# Altium footprint library Footprints.PcbLib: 45 footprints (part 2 of 3)
Each footprint in its own frame and in the unit in brackets; x right, y up, seen from the top. Pads: shape width x height; smd on the part's side, far side on the other; paste and mask are expansions set on the pad; w line width, h text height; cw(c..) or ccw(c..) is an arc to the next point about the centre after c.
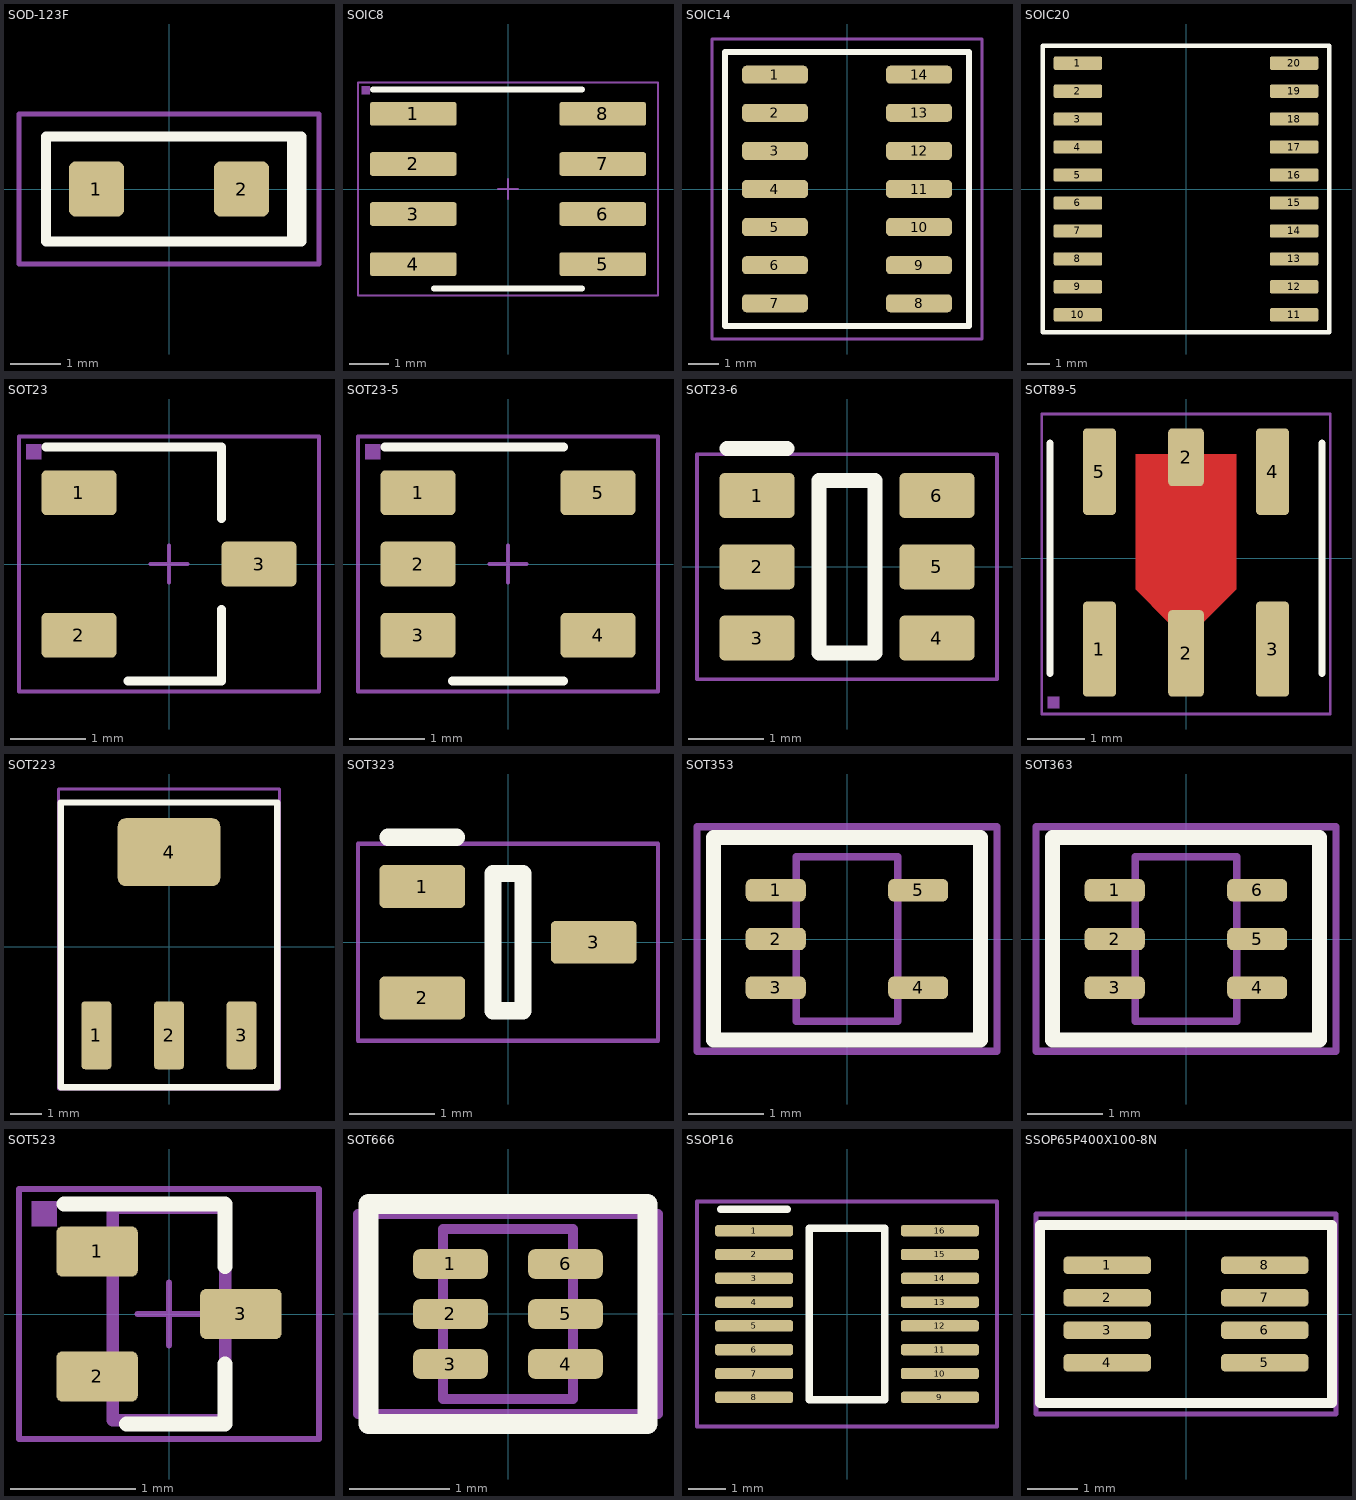
[diagram p1: the footprints below, top view; thin cyan lines are the x and y axes]

## SOD-123F [mm]
pads (2):
  rrect23% 1.1x1.1 smd: 1(-1.45,0) 2(1.45,0)
Top Overlay:
  lines w0.2: 2.464,-1.05 2.65,-1.05 2.65,1.05 2.464,1.05 ; 2.464,-1.05 2.464,1.05 ; 2.464,-1.05 -2.464,-1.05 -2.464,1.05 2.464,1.05
15. Courtyard TOP:
  lines w0.1: -3,-1.5 -3,1.5 3,1.5 3,-1.5 -3,-1.5
  text ".designator" at -1.5,-0.5 h1
3D body: height 1.35, standoff 0, extent -1.85,-0.775 1.85,0.775

## SOIC8 [mm] "SOIC, 8-Leads, Body 5,0x4,0mm (max), Pitch 1,27mm, IPC Medium Density"
height 1.75
pads (8):
  rrect23% 2.2x0.6 smd: 1(-2.4,1.905) 2(-2.4,0.635) 3(-2.4,-0.635) 4(-2.4,-1.905) 5(2.4,-1.905) 6(2.4,-0.635) 7(2.4,0.635) 8(2.4,1.905)
Top Overlay:
  lines w0.15: -3.425,2.525 1.875,2.525 ; -1.875,-2.525 1.875,-2.525
15. Courtyard TOP:
  lines w0.05: -0.25,0 0.25,0 ; 0,-0.25 0,0.25 ; -3.8,-2.7 -3.8,2.7 3.8,2.7 3.8,-2.7 -3.8,-2.7
18. Assembly TOP:
  region: -3.7,2.6 -3.5,2.6 -3.5,2.4 -3.7,2.4
  lines w0.05: -3.8,-2.7 -3.8,2.7 3.8,2.7 3.8,-2.7 -3.8,-2.7
  text ".designator" at -3.3,-0.7 h1.5
3D body: height 1.75, standoff 0, extent -3,-2.45 3,2.45

## SOIC14 [mm]
height 1.75
pads (14):
  rrect50% 2.2x0.6 smd: 1(-2.4,3.81) 2(-2.4,2.54) 3(-2.4,1.27) 4(-2.4,0) 5(-2.4,-1.27) 6(-2.4,-2.54) 7(-2.4,-3.81) 8(2.4,-3.81) 9(2.4,-2.54) 10(2.4,-1.27) 11(2.4,0) 12(2.4,1.27) 13(2.4,2.54) 14(2.4,3.81)
Top Overlay:
  lines w0.2: -4.064,-4.572 4.064,-4.572 4.064,4.572 -4.064,4.572 -4.064,-4.572
15. Courtyard TOP:
  lines w0.1: -4.5,-5 4.5,-5 4.5,5 -4.5,5 -4.5,-5
  text "." at -3.2,3.9 h1
  text ".designator" at -1.905,-0.635 h2
3D body: height 1.7, standoff 0, extent -3,-4.4 3,4.4

## SOIC20 [mm]
height 1.75
pads (20):
  rrect23% 2.2x0.6 smd: 1(-4.91,5.715) 2(-4.91,4.445) 3(-4.91,3.175) 4(-4.91,1.905) 5(-4.91,0.635) 6(-4.91,-0.635) 7(-4.91,-1.905) 8(-4.91,-3.175) 9(-4.91,-4.445) 10(-4.91,-5.715) 11(4.91,-5.715) 12(4.91,-4.445) 13(4.91,-3.175) 14(4.91,-1.905) 15(4.91,-0.635) 16(4.91,0.635) 17(4.91,1.905) 18(4.91,3.175) 19(4.91,4.445) 20(4.91,5.715)
Top Overlay:
  lines w0.2: -6.5,-6.5 -6.5,6.5 6.5,6.5 6.5,-6.5 -6.5,-6.5
15. Courtyard TOP:
  lines w0.1: -6.5,-6.5 -6.5,6.5 6.5,6.5 6.5,-6.5 -6.5,-6.5
  text "." at -6,6 h1
  text ".designator" at -2,-0.5 h2
3D body: height 2.65, standoff 0, extent -5.15,-6.4 5.15,6.4

## SOT23 [mm]
pads (3):
  rrect23% 1x0.6 smd mask+0.1: 1(-1.2,0.95) 2(-1.2,-0.95) 3(1.2,0)
Top Overlay:
  lines w0.12: -1.64,1.56 0.7,1.56 0.7,0.61 ; -0.55,-1.56 0.7,-1.56 0.7,-0.61
15. Courtyard TOP:
  lines w0.05: -0.25,0 0.25,0 ; 0,-0.25 0,0.25 ; -2,-1.7 -2,1.7 2,1.7 2,-1.7 -2,-1.7
18. Assembly TOP:
  region: -1.9,1.6 -1.7,1.6 -1.7,1.4 -1.9,1.4
  lines w0.05: -2,-1.7 2,-1.7 2,1.7 -2,1.7 -2,-1.7
  text ".designator" at -1.825,-0.475 h1
3D body: height 1.3, standoff 0, extent -1.393,-1.45 1.407,1.45

## SOT23-5 [mm]
height 1.1
pads (5):
  rrect23% 1x0.6 smd mask+0.1: 1(-1.2,0.95) 2(-1.2,0) 3(-1.2,-0.95) 4(1.2,-0.95) 5(1.2,0.95)
Top Overlay:
  lines w0.12: -1.64,1.56 0.74,1.56 ; -0.74,-1.56 0.74,-1.56
15. Courtyard TOP:
  lines w0.05: -0.25,0 0.25,0 ; 0,-0.25 0,0.25 ; -2,-1.7 2,-1.7 2,1.7 -2,1.7 -2,-1.7
18. Assembly TOP:
  region: -1.9,1.6 -1.7,1.6 -1.7,1.4 -1.9,1.4
  lines w0.05: -2,-1.7 -2,1.7 2,1.7 2,-1.7 -2,-1.7
  text ".designator" at -1.775,-0.475 h1
3D body: height 1.45, standoff 0, extent -1.4,-1.45 1.4,1.45

## SOT23-6 [mm]
pads (6):
  rrect23% 1x0.6 smd mask+0.1: 1(-1.2,0.95) 2(-1.2,0) 3(-1.2,-0.95) 4(1.2,-0.95) 5(1.2,0) 6(1.2,0.95)
Top Overlay:
  lines w0.2: -1.6,1.575 -0.8,1.575 ; -0.375,-1.15 -0.375,1.15 0.375,1.15 0.375,-1.15 -0.375,-1.15
15. Courtyard TOP:
  lines w0.05: -2,-1.5 2,-1.5 2,1.5 -2,1.5 -2,-1.5
  text ".designator" at -1.492,-0.382 h1
3D body: height 1.09, standoff 0, extent -1.2,-1.397 1.226,1.397

## SOT89-5 [mm]
height 1.6
pads (6):
  rrect23% 0.57x1.65 smd: 1(-1.5,-1.575) 3(1.5,-1.575)
  rrect23% 0.62x1.5 smd: 2(0,-1.65)
  rrect23% 0.62x1 smd: 2(0,1.75)
  rrect23% 0.57x1.5 smd paste+0: 4(1.5,1.5)
  rrect23% 0.57x1.5 smd: 5(-1.5,1.5)
Top Layer:
  region: -0.875,1.8 0.875,1.8 0.875,-0.54 0.87,-0.54 0.31,-1.1 -0.315,-1.1 -0.875,-0.54
Top Overlay:
  lines w0.12: -2.36,-2 -2.36,2 ; 2.36,-2 2.36,2
15. Courtyard TOP:
  lines w0.05: -0.25,-0.1 0.25,-0.1 ; 0,-0.35 0,0.15 ; -2.5,-2.7 -2.5,2.5 2.5,2.5 2.5,-2.7 -2.5,-2.7
18. Assembly TOP:
  region: -2.4,-2.6 -2.4,-2.4 -2.2,-2.4 -2.2,-2.6
  lines w0.05: -2.5,-2.7 -2.5,2.5 2.5,2.5 2.5,-2.7 -2.5,-2.7
  text ".designator" at -2.6,-0.6 h1.2
3D body: height 1, standoff 0, extent -2.3,-1.3 2.3,1.3

## SOT223 [mm] "Small Outline Transitor"
pads (4):
  rrect23% 0.95x2.15 smd: 1(-2.3,-2.8) 2(0,-2.8) 3(2.3,-2.8)
  rrect23% 3.25x2.15 smd: 4(0,3)
Top Overlay:
  lines w0.2: -3.429,-4.445 -3.429,4.572 3.429,4.572 3.429,-4.445 -3.429,-4.445
15. Courtyard TOP:
  lines w0.1: -3.5,-4.5 3.5,-4.5 3.5,5 -3.5,5 -3.5,-4.5
  text "." at -2.5,-3.7 h1
  text ".designator" at -2.159,-0.381 h1
3D body: height 1.67, standoff 0.02, extent -3.25,-3.5 3.25,3.5

## SOT323 [mm] "Small Outline Transistor"
pads (3):
  rrect23% 1x0.5 smd mask+0.1: 1(-1,0.65) 2(-1,-0.65) 3(1,0)
Top Overlay:
  lines w0.2: -1.4,1.225 -0.6,1.225 ; -0.175,-0.8 0.175,-0.8 0.175,0.8 -0.175,0.8 -0.175,-0.8
15. Courtyard TOP:
  lines w0.05: -1.75,-1.15 1.75,-1.15 1.75,1.15 -1.75,1.15 -1.75,-1.15
  text ".designator" at -1.291,-0.333 h1
  text "." at -1.4,0.8 h1
3D body: height 1.1, standoff 0, extent -1.123,-1.1 1.123,1.1

## SOT353 [mm]
pads (5):
  rrect50% 0.8x0.3 smd: 1(-0.95,0.65) 2(-0.95,0) 3(-0.95,-0.65) 4(0.95,-0.65) 5(0.95,0.65)
Top Overlay:
  lines w0.2: -1.778,-1.35 1.778,-1.35 1.778,1.35 -1.778,1.35 -1.778,-1.35
13. 3D Model TOP:
  lines w0.1: -0.675,-1.1 -0.675,1.1 0.675,1.1 0.675,-1.1 -0.675,-1.1
15. Courtyard TOP:
  lines w0.1: -2,-1.5 2,-1.5 2,1.5 -2,1.5 -2,-1.5
  text ".designator" at -1.27,-0.508 h1
  text "." at -1.3,0.9 h1
3D body: height 1, standoff 0, extent -1.15,-1.05 1.15,1.05

## SOT363 [mm] "SOT23, 6-Leads, Body 2,2x2,2mm (max), Pitch 0,65mm, IPC Medium Density"
height 1
pads (6):
  rrect50% 0.8x0.3 smd: 1(-0.95,0.65) 2(-0.95,0) 3(-0.95,-0.65) 4(0.95,-0.65) 5(0.95,0) 6(0.95,0.65)
Top Overlay:
  lines w0.2: -1.778,-1.35 -1.778,1.35 1.778,1.35 1.778,-1.35 -1.778,-1.35
13. 3D Model TOP:
  lines w0.1: -0.675,-1.1 0.675,-1.1 0.675,1.1 -0.675,1.1 -0.675,-1.1
15. Courtyard TOP:
  lines w0.1: -2,-1.5 -2,1.5 2,1.5 2,-1.5 -2,-1.5
  text ".designator" at -1.27,-0.508 h1
  text "." at -1.3,0.9 h1
3D body: height 1, standoff 0, extent -1.15,-1.05 1.15,1.05

## SOT523 [mm] "SOT-523 / SC-75"
height 0.8
pads (3):
  rrect23% 0.65x0.4 smd mask+0.1: 1(-0.575,0.5) 2(-0.575,-0.5) 3(0.575,0)
Top Overlay:
  lines w0.12: -0.84,0.88 0.45,0.88 0.45,0.38 ; -0.34,-0.88 0.45,-0.88 0.45,-0.4
15. Courtyard TOP:
  lines w0.05: -0.25,0 0.25,0 ; 0,-0.25 0,0.25 ; -1.2,-1 -1.2,1 1.2,1 1.2,-1 -1.2,-1
17. Comp.body:
  lines w0.1: -0.45,-0.85 -0.45,0.85 0.45,0.85 0.45,-0.85 -0.45,-0.85
18. Assembly TOP:
  region: -1.1,0.9 -0.9,0.9 -0.9,0.7 -1.1,0.7
  lines w0.05: -1.2,-1 1.2,-1 1.2,1 -1.2,1 -1.2,-1
  text "Q200" at -0.925,-0.25 h0.5
3D body: height 0.8, standoff 0, extent -0.8,-0.8 0.8,0.8

## SOT666 [mm] "SOT666, 6-Leads, Body 1.7x1.3mm (max), Pitch 0.50mm, IPC Medium Density"
height 0.6
pads (6):
  rrect50% 0.75x0.3 smd: 1(-0.575,0.5) 2(-0.575,0) 3(-0.575,-0.5) 4(0.575,-0.5) 5(0.575,0) 6(0.575,0.5)
Top Overlay:
  lines w0.2: -1.397,-1.1 1.397,-1.1 1.397,1.1 -1.397,1.1 -1.397,-1.1
13. 3D Model TOP:
  lines w0.1: -0.65,-0.85 -0.65,0.85 0.65,0.85 0.65,-0.85 -0.65,-0.85
15. Courtyard TOP:
  lines w0.1: -1.5,-1 1.5,-1 1.5,1 -1.5,1 -1.5,-1
  text "." at -0.9,0.6 h1
  text ".designator" at -0.838,-0.406 h1
3D body: height 0.6, standoff 0, extent -0.85,-0.85 0.85,0.85

## SSOP16 [mil]
pads (16):
  rrect50% 82x12 smd: 1(-97.5,87.5) 2(-97.5,62.5) 3(-97.5,37.5) 4(-97.5,12.5) 5(-97.5,-12.5) 6(-97.5,-37.5) 7(-97.5,-62.5) 8(-97.5,-87.5) 9(97.5,-87.5) 10(97.5,-62.5) 11(97.5,-37.5) 12(97.5,-12.5) 13(97.5,12.5) 14(97.5,37.5) 15(97.5,62.5) 16(97.5,87.5)
Top Overlay:
  lines w7.87: -132.5,110 -62.5,110 ; -39.37,-90 -39.37,90 39.37,90 39.37,-90 -39.37,-90
15. Courtyard TOP:
  lines w3.94: -157.48,-118.11 -157.48,118.11 157.48,118.11 157.48,-118.11 -157.48,-118.11
  text "." at -129.92,78.74 h39.37
  text ".designator" at -39.37,-19.68 h39.37
3D body: height 42.88, standoff -0.43, extent -118,-98 118,98

## SSOP65P400X100-8N [mm] "SSOP, 8-Leads, Body 3,0x2,9mm (max), Pitch 0,65mm, IPC Medium Density"
height 1
pads (8):
  rrect50% 1.75x0.35 smd: 1(-1.575,0.975) 2(-1.575,0.325) 3(-1.575,-0.325) 4(-1.575,-0.975) 5(1.575,-0.975) 6(1.575,-0.325) 7(1.575,0.325) 8(1.575,0.975)
Top Overlay:
  lines w0.2: -2.921,-1.778 -2.921,1.778 2.921,1.778 2.921,-1.778 -2.921,-1.778
15. Courtyard TOP:
  lines w0.1: -3,-2 3,-2 3,2 -3,2 -3,-2
  text "." at -2.3,1.2 h1
  text ".designator" at -0.9,-0.4 h1
3D body: height 1.1, standoff 0, extent -2.05,-1.55 2.05,1.55